# Altium footprint library Connector.PcbLib: 37 footprints (part 3 of 3)
Each footprint in its own frame and in the unit in brackets; x right, y up, seen from the top. Pads: shape width x height; smd on the part's side, far side on the other; paste and mask are expansions set on the pad; w line width, h text height; cw(c..) or ccw(c..) is an arc to the next point about the centre after c.
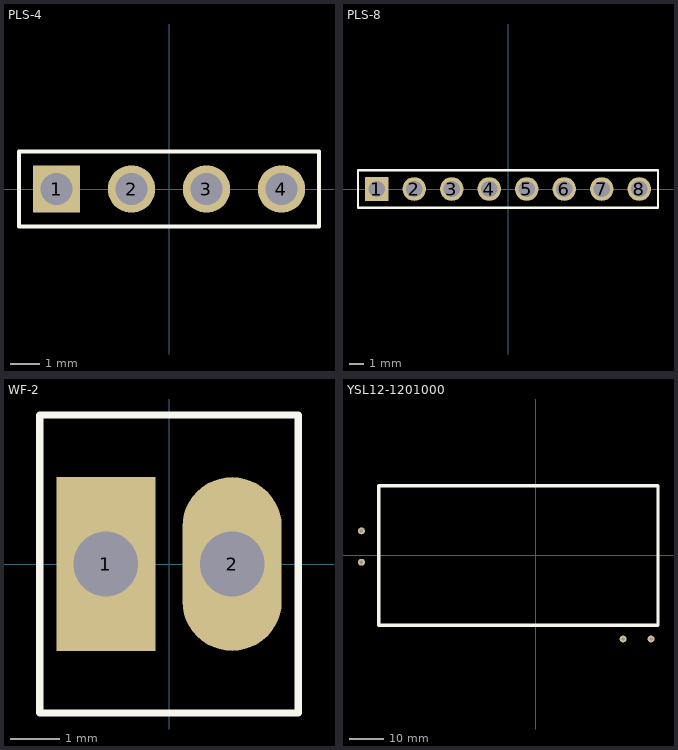
[diagram p2: the footprints below, top view; thin cyan lines are the x and y axes]

## PLS-4 [mm]
pads (4):
  rect 1.6x1.6 hole 1.1: 1(-3.81,0)
  round 1.6 hole 1.1: 2(-1.27,0) 3(1.27,0) 4(3.81,0)
Top Overlay:
  lines w0.15: -5.08,-1.27 5.08,-1.27 5.08,1.27 -5.08,1.27 -5.08,-1.27
3D body "PLS-1.STEP": height 8.5, standoff -3, extent 2.54,-1.27 5.08,1.27
3D body "PLS-1.STEP": height 8.5, standoff -3, extent 0,-1.27 2.54,1.27
3D body "PLS-1.STEP": height 8.5, standoff -3, extent -2.54,-1.27 0,1.27
3D body "PLS-1.STEP": height 8.5, standoff -3, extent -5.08,-1.27 -2.54,1.27

## PLS-8 [mm]
pads (8):
  rect 1.6x1.6 hole 1.1: 1(-8.89,0)
  round 1.6 hole 1.1: 2(-6.35,0) 3(-3.81,0) 4(-1.27,0) 5(1.27,0) 6(3.81,0) 7(6.35,0) 8(8.89,0)
Top Overlay:
  lines w0.15: -10.16,-1.27 10.16,-1.27 10.16,1.27 -10.16,1.27 -10.16,-1.27
3D body "PLS-1.STEP": height 8.5, standoff -3, extent 7.62,-1.27 10.16,1.27
3D body "PLS-1.STEP": height 8.5, standoff -3, extent 5.08,-1.27 7.62,1.27
3D body "PLS-1.STEP": height 8.5, standoff -3, extent 2.54,-1.27 5.08,1.27
3D body "PLS-1.STEP": height 8.5, standoff -3, extent 0,-1.27 2.54,1.27
3D body "PLS-1.STEP": height 8.5, standoff -3, extent -2.54,-1.27 0,1.27
3D body "PLS-1.STEP": height 8.5, standoff -3, extent -5.08,-1.27 -2.54,1.27
3D body "PLS-1.STEP": height 8.5, standoff -3, extent -7.62,-1.27 -5.08,1.27
3D body "PLS-1.STEP": height 8.5, standoff -3, extent -10.16,-1.27 -7.62,1.27

## StorkTale [mm]
3D body: height 1.73, standoff 1.7, extent 7.65,-1.35 10.35,-0.65
3D body: height 1.73, standoff 1.7, extent 7.65,-5.35 10.35,-4.65
3D body: height 1.73, standoff 1.7, extent 7.65,-4.35 10.35,-3.65
3D body: height 1.73, standoff 1.7, extent 7.65,-3.35 10.35,-2.65
3D body: height 1.73, standoff 1.7, extent 7.65,-2.35 10.35,-1.65
3D body: height 1.73, standoff 1.7, extent 7.65,-9.35 10.35,-8.65
3D body: height 1.73, standoff 1.7, extent 7.65,-8.35 10.35,-7.65
3D body: height 1.73, standoff 1.7, extent 7.65,-7.35 10.35,-6.65
3D body: height 1.73, standoff 1.7, extent 7.65,-6.35 10.35,-5.65
3D body: height 1.73, standoff 1.7, extent 7.65,-10.35 10.35,-9.65
3D body: height 1.73, standoff 1.7, extent 7.65,-11.35 10.35,-10.65
3D body: height 1.73, standoff 1.7, extent 7.65,-12.35 10.35,-11.65
3D body: height 1.7, standoff 1.6, extent 1,-14 11,5
3D body: height 5, standoff 1.2, extent 5,5 13.9,25
3D body: height 5, standoff 1.2, extent -3.9,5 5,25
3D body: height 1.73, standoff 1.7, extent 7.65,-13.35 10.35,-12.65

## WF-2 [mm]
pads (2):
  rect 2x3.5 hole 1.3: 1(-1.27,0)
  oval 2x3.5 hole 1.3: 2(1.27,0)
Top Overlay:
  lines w0.15: -2.6,-3 -2.6,3 2.6,3 2.6,-3 -2.6,-3
3D body "SNP389.STEP": height 11.4, standoff -3.4, extent 0,-2.9 2.54,2.9
3D body "SNP389.STEP": height 11.4, standoff -3.4, extent -2.54,-2.9 0,2.9

## YSL12-1201000 [mm]
height 24
pads (4):
  round 2 hole 1: 1(-50,7) 2(-50,-2) 3(25,-24) 4(33,-24)
Top Overlay:
  lines w1: -45,-20 -45,20 35,20 35,-20 -45,-20
3D body: height 4, standoff 0.1, extent -45,-20 -35,-2.5
3D body: height 4, standoff 0.1, extent -45,2.5 -35,20
3D body: height 24, standoff 0.1, extent -35,-20 25,20
3D body: height 4, standoff 0.1, extent 25,-20 35,-2.5
3D body: height 4, standoff 0.1, extent 25,2.5 35,20